# Altium footprint library 1.27贴片排母.PcbLib: 30 footprints (part 1 of 2)
Each footprint in its own frame and in the unit in brackets; x right, y up, seen from the top. Pads: shape width x height; smd on the part's side, far side on the other; paste and mask are expansions set on the pad; w line width, h text height; cw(c..) or ccw(c..) is an arc to the next point about the centre after c.
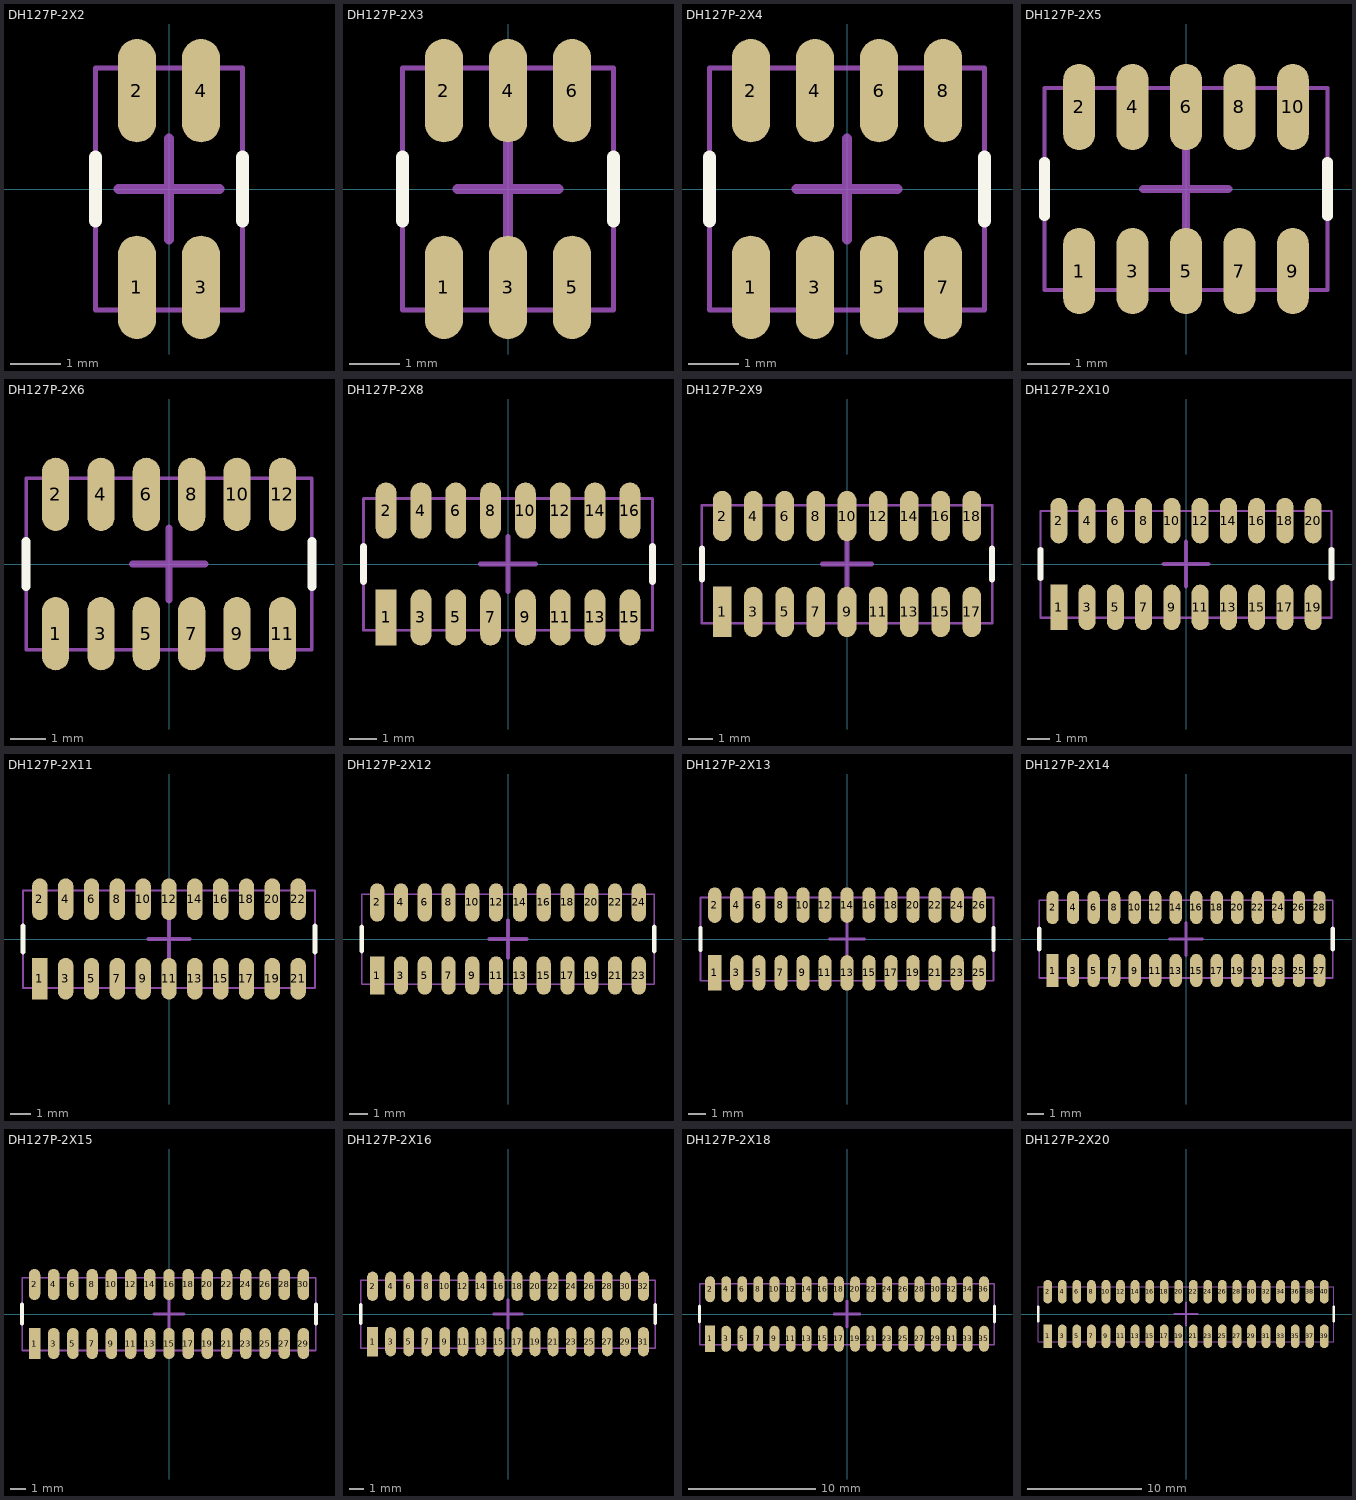
[diagram p0: the footprints below, top view; thin cyan lines are the x and y axes]

## DH127P-2X2 [mm] "1.27mm脚距双排母"
height 3.6
pads (4):
  oval 0.76x2.05 smd: 1(-0.635,-1.95) 2(-0.635,1.95) 3(0.635,-1.95) 4(0.635,1.95)
Top Overlay:
  lines w0.254: -1.46,-0.635 -1.46,0.635 ; 1.46,-0.635 1.46,0.635
Mechanical 13:
  lines w0.1: -1.46,-2.4 1.46,-2.4 1.46,2.4 -1.46,2.4 -1.46,-2.4
Mechanical 15:
  lines w0.2: -1,0 1,0 ; 0,-1 0,1
3D body: height 3.6, standoff -0.02, extent -1.46,-2.4 1.46,2.4

## DH127P-2X3 [mm] "1.27mm脚距双排母"
height 3.6
pads (6):
  oval 0.76x2.05 smd: 1(-1.27,-1.95) 2(-1.27,1.95) 3(0,-1.95) 4(0,1.95) 5(1.27,-1.95) 6(1.27,1.95)
Top Overlay:
  lines w0.254: -2.095,-0.635 -2.095,0.635 ; 2.095,-0.635 2.095,0.635
Mechanical 13:
  lines w0.1: -2.095,-2.4 -2.095,2.4 2.095,2.4 2.095,-2.4 -2.095,-2.4
Mechanical 15:
  lines w0.2: -1,0 1,0 ; 0,-1 0,1
3D body: height 3.6, standoff -0.02, extent -2.095,-2.4 2.095,2.4

## DH127P-2X4 [mm] "1.27mm脚距双排母"
height 3.6
pads (8):
  oval 0.76x2.05 smd: 1(-1.905,-1.95) 2(-1.905,1.95) 3(-0.635,-1.95) 4(-0.635,1.95) 5(0.635,-1.95) 6(0.635,1.95) 7(1.905,-1.95) 8(1.905,1.95)
Top Overlay:
  lines w0.254: -2.73,-0.635 -2.73,0.635 ; 2.73,-0.635 2.73,0.635
Mechanical 13:
  lines w0.1: -2.73,-2.4 -2.73,2.4 2.73,2.4 2.73,-2.4 -2.73,-2.4
Mechanical 15:
  lines w0.2: -1,0 1,0 ; 0,-1 0,1
3D body: height 3.6, standoff -0.02, extent -2.73,-2.4 2.73,2.4

## DH127P-2X5 [mm] "1.27mm脚距双排母"
height 3.6
pads (10):
  oval 0.76x2.05 smd: 1(-2.54,-1.95) 2(-2.54,1.95) 3(-1.27,-1.95) 4(-1.27,1.95) 5(0,-1.95) 6(0,1.95) 7(1.27,-1.95) 8(1.27,1.95) 9(2.54,-1.95) 10(2.54,1.95)
Top Overlay:
  lines w0.254: -3.365,-0.635 -3.365,0.635 ; 3.365,-0.635 3.365,0.635
Mechanical 13:
  lines w0.1: -3.365,-2.4 -3.365,2.4 3.365,2.4 3.365,-2.4 -3.365,-2.4
Mechanical 15:
  lines w0.2: -1.016,0 1,0 ; 0,-1 0,1
3D body: height 3.6, standoff -0.02, extent -3.365,-2.4 3.365,2.4

## DH127P-2X6 [mm] "1.27mm脚距双排母"
height 3.6
pads (12):
  oval 0.76x2.05 smd: 1(-3.175,-1.95) 2(-3.175,1.95) 3(-1.905,-1.95) 4(-1.905,1.95) 5(-0.635,-1.95) 6(-0.635,1.95) 7(0.635,-1.95) 8(0.635,1.95) 9(1.905,-1.95) 10(1.905,1.95) 11(3.175,-1.95) 12(3.175,1.95)
Top Overlay:
  lines w0.254: -4,-0.635 -4,0.635 ; 4,-0.635 4,0.635
Mechanical 13:
  lines w0.1: -4,-2.4 4,-2.4 4,2.4 -4,2.4 -4,-2.4
Mechanical 15:
  lines w0.2: -1.016,0 1,0 ; 0,-1 0,1
3D body: height 3.6, standoff -0.02, extent -4,-2.4 4,2.4

## DH127P-2X8 [mm] "1.27mm脚距双排母"
height 3.6
pads (16):
  rect 0.76x2.05 smd: 1(-4.445,-1.95)
  oval 0.76x2.05 smd: 2(-4.445,1.95) 3(-3.175,-1.95) 4(-3.175,1.95) 5(-1.905,-1.95) 6(-1.905,1.95) 7(-0.635,-1.95) 8(-0.635,1.95) 9(0.635,-1.95) 10(0.635,1.95) 11(1.905,-1.95) 12(1.905,1.95) 13(3.175,-1.95) 14(3.175,1.95) 15(4.445,-1.95) 16(4.445,1.95)
Top Overlay:
  lines w0.254: -5.27,-0.635 -5.27,0.635 ; 5.27,-0.635 5.27,0.635
Mechanical 13:
  lines w0.1: -5.27,-2.413 -5.27,2.387 5.27,2.387 5.27,-2.413 -5.27,-2.413
Mechanical 15:
  lines w0.2: -1,0 1,0 ; 0,-1 0,1
3D body: height 3.6, standoff -0.02, extent -5.27,-2.413 5.27,2.387

## DH127P-2X9 [mm] "1.27mm脚距双排母"
height 3.6
pads (18):
  rect 0.76x2.05 smd: 1(-5.08,-1.95)
  oval 0.76x2.05 smd: 2(-5.08,1.95) 3(-3.81,-1.95) 4(-3.81,1.95) 5(-2.54,-1.95) 6(-2.54,1.95) 7(-1.27,-1.95) 8(-1.27,1.95) 9(0,-1.95) 10(0,1.95) 11(1.27,-1.95) 12(1.27,1.95) 13(2.54,-1.95) 14(2.54,1.95) 15(3.81,-1.95) 16(3.81,1.95) 17(5.08,-1.95) 18(5.08,1.95)
Top Overlay:
  lines w0.254: -5.905,-0.635 -5.905,0.635 ; 5.905,-0.635 5.905,0.635
Mechanical 13:
  lines w0.1: -5.905,-2.413 -5.905,2.387 5.905,2.387 5.905,-2.413 -5.905,-2.413
Mechanical 15:
  lines w0.2: -1,0 1,0 ; 0,-1 0,1
3D body: height 3.6, standoff -0.02, extent -5.905,-2.413 5.905,2.387

## DH127P-2X10 [mm] "1.27mm脚距双排母"
height 3.6
pads (20):
  rect 0.76x2.05 smd: 1(-5.715,-1.95)
  oval 0.76x2.05 smd: 2(-5.715,1.95) 3(-4.445,-1.95) 4(-4.445,1.95) 5(-3.175,-1.95) 6(-3.175,1.95) 7(-1.905,-1.95) 8(-1.905,1.95) 9(-0.635,-1.95) 10(-0.635,1.95) 11(0.635,-1.95) 12(0.635,1.95) 13(1.905,-1.95) 14(1.905,1.95) 15(3.175,-1.95) 16(3.175,1.95) 17(4.445,-1.95) 18(4.445,1.95) 19(5.715,-1.95) 20(5.715,1.95)
Top Overlay:
  lines w0.254: -6.54,-0.635 -6.54,0.635 ; 6.54,-0.635 6.54,0.635
Mechanical 13:
  lines w0.1: -6.54,-2.413 -6.54,2.387 6.54,2.387 6.54,-2.413 -6.54,-2.413
Mechanical 15:
  lines w0.2: -1,0 1,0 ; 0,-1 0,1
3D body: height 3.6, standoff -0.02, extent -6.54,-2.413 6.54,2.387

## DH127P-2X11 [mm] "1.27mm脚距双排母"
height 3.6
pads (22):
  rect 0.76x2.05 smd: 1(-6.35,-1.95)
  oval 0.76x2.05 smd: 2(-6.35,1.95) 3(-5.08,-1.95) 4(-5.08,1.95) 5(-3.81,-1.95) 6(-3.81,1.95) 7(-2.54,-1.95) 8(-2.54,1.95) 9(-1.27,-1.95) 10(-1.27,1.95) 11(0,-1.95) 12(0,1.95) 13(1.27,-1.95) 14(1.27,1.95) 15(2.54,-1.95) 16(2.54,1.95) 17(3.81,-1.95) 18(3.81,1.95) 19(5.08,-1.95) 20(5.08,1.95) 21(6.35,-1.95) 22(6.35,1.95)
Top Overlay:
  lines w0.254: -7.175,-0.635 -7.175,0.635 ; 7.175,-0.635 7.175,0.635
Mechanical 13:
  lines w0.1: -7.175,-2.413 -7.175,2.387 7.175,2.387 7.175,-2.413 -7.175,-2.413
Mechanical 15:
  lines w0.2: -1,0 1,0 ; 0,-1 0,1
3D body: height 3.6, standoff -0.02, extent -7.175,-2.413 7.175,2.387

## DH127P-2X12 [mm] "1.27mm脚距双排母"
height 3.6
pads (24):
  rect 0.76x2.05 smd: 1(-6.985,-1.95)
  oval 0.76x2.05 smd: 2(-6.985,1.95) 3(-5.715,-1.95) 4(-5.715,1.95) 5(-4.445,-1.95) 6(-4.445,1.95) 7(-3.175,-1.95) 8(-3.175,1.95) 9(-1.905,-1.95) 10(-1.905,1.95) 11(-0.635,-1.95) 12(-0.635,1.95) 13(0.635,-1.95) 14(0.635,1.95) 15(1.905,-1.95) 16(1.905,1.95) 17(3.175,-1.95) 18(3.175,1.95) 19(4.445,-1.95) 20(4.445,1.95) 21(5.715,-1.95) 22(5.715,1.95) 23(6.985,-1.95) 24(6.985,1.95)
Top Overlay:
  lines w0.254: -7.81,-0.635 -7.81,0.635 ; 7.81,-0.635 7.81,0.635
Mechanical 13:
  lines w0.1: -7.81,-2.413 7.81,-2.413 7.81,2.387 -7.81,2.387 -7.81,-2.413
Mechanical 15:
  lines w0.2: -1,0 1,0 ; 0,-1 0,1
3D body: height 3.6, standoff -0.02, extent -7.81,-2.413 7.81,2.387

## DH127P-2X13 [mm] "1.27mm脚距双排母"
height 3.6
pads (26):
  rect 0.76x2.05 smd: 1(-7.62,-1.95)
  oval 0.76x2.05 smd: 2(-7.62,1.95) 3(-6.35,-1.95) 4(-6.35,1.95) 5(-5.08,-1.95) 6(-5.08,1.95) 7(-3.81,-1.95) 8(-3.81,1.95) 9(-2.54,-1.95) 10(-2.54,1.95) 11(-1.27,-1.95) 12(-1.27,1.95) 13(0,-1.95) 14(0,1.95) 15(1.27,-1.95) 16(1.27,1.95) 17(2.54,-1.95) 18(2.54,1.95) 19(3.81,-1.95) 20(3.81,1.95) 21(5.08,-1.95) 22(5.08,1.95) 23(6.35,-1.95) 24(6.35,1.95) 25(7.62,-1.95) 26(7.62,1.95)
Top Overlay:
  lines w0.254: -8.445,-0.635 -8.445,0.635 ; 8.445,-0.635 8.445,0.635
Mechanical 13:
  lines w0.1: -8.445,-2.413 8.445,-2.413 8.445,2.387 -8.445,2.387 -8.445,-2.413
Mechanical 15:
  lines w0.2: -1,0 1,0 ; 0,-1 0,1
3D body: height 3.6, standoff -0.02, extent -8.445,-2.413 8.445,2.387

## DH127P-2X14 [mm] "1.27mm脚距双排母"
height 3.6
pads (28):
  rect 0.76x2.05 smd: 1(-8.255,-1.95)
  oval 0.76x2.05 smd: 2(-8.255,1.95) 3(-6.985,-1.95) 4(-6.985,1.95) 5(-5.715,-1.95) 6(-5.715,1.95) 7(-4.445,-1.95) 8(-4.445,1.95) 9(-3.175,-1.95) 10(-3.175,1.95) 11(-1.905,-1.95) 12(-1.905,1.95) 13(-0.635,-1.95) 14(-0.635,1.95) 15(0.635,-1.95) 16(0.635,1.95) 17(1.905,-1.95) 18(1.905,1.95) 19(3.175,-1.95) 20(3.175,1.95) 21(4.445,-1.95) 22(4.445,1.95) 23(5.715,-1.95) 24(5.715,1.95) 25(6.985,-1.95) 26(6.985,1.95) 27(8.255,-1.95) 28(8.255,1.95)
Top Overlay:
  lines w0.254: -9.08,-0.635 -9.08,0.635 ; 9.08,-0.635 9.08,0.635
Mechanical 13:
  lines w0.1: -9.08,-2.413 9.08,-2.413 9.08,2.387 -9.08,2.387 -9.08,-2.413
Mechanical 15:
  lines w0.2: -1,0 1,0 ; 0,-1 0,1
3D body: height 3.6, standoff -0.02, extent -9.08,-2.413 9.08,2.387

## DH127P-2X15 [mm] "1.27mm脚距双排母"
height 3.6
pads (30):
  rect 0.76x2.05 smd: 1(-8.89,-1.95)
  oval 0.76x2.05 smd: 2(-8.89,1.95) 3(-7.62,-1.95) 4(-7.62,1.95) 5(-6.35,-1.95) 6(-6.35,1.95) 7(-5.08,-1.95) 8(-5.08,1.95) 9(-3.81,-1.95) 10(-3.81,1.95) 11(-2.54,-1.95) 12(-2.54,1.95) 13(-1.27,-1.95) 14(-1.27,1.95) 15(0,-1.95) 16(0,1.95) 17(1.27,-1.95) 18(1.27,1.95) 19(2.54,-1.95) 20(2.54,1.95) 21(3.81,-1.95) 22(3.81,1.95) 23(5.08,-1.95) 24(5.08,1.95) 25(6.35,-1.95) 26(6.35,1.95) 27(7.62,-1.95) 28(7.62,1.95) 29(8.89,-1.95) 30(8.89,1.95)
Top Overlay:
  lines w0.254: -9.715,-0.635 -9.715,0.635 ; 9.715,-0.635 9.715,0.635
Mechanical 13:
  lines w0.1: -9.715,-2.413 -9.715,2.387 9.715,2.387 9.715,-2.413 -9.715,-2.413
Mechanical 15:
  lines w0.2: -1,0 1,0 ; 0,-1 0,1
3D body: height 3.6, standoff -0.02, extent -9.715,-2.413 9.715,2.387

## DH127P-2X16 [mm] "1.27mm脚距双排母"
height 3.6
pads (32):
  rect 0.76x2.05 smd: 1(-9.525,-1.95)
  oval 0.76x2.05 smd: 2(-9.525,1.95) 3(-8.255,-1.95) 4(-8.255,1.95) 5(-6.985,-1.95) 6(-6.985,1.95) 7(-5.715,-1.95) 8(-5.715,1.95) 9(-4.445,-1.95) 10(-4.445,1.95) 11(-3.175,-1.95) 12(-3.175,1.95) 13(-1.905,-1.95) 14(-1.905,1.95) 15(-0.635,-1.95) 16(-0.635,1.95) 17(0.635,-1.95) 18(0.635,1.95) 19(1.905,-1.95) 20(1.905,1.95) 21(3.175,-1.95) 22(3.175,1.95) 23(4.445,-1.95) 24(4.445,1.95) 25(5.715,-1.95) 26(5.715,1.95) 27(6.985,-1.95) 28(6.985,1.95) 29(8.255,-1.95) 30(8.255,1.95) 31(9.525,-1.95) 32(9.525,1.95)
Top Overlay:
  lines w0.254: -10.35,-0.635 -10.35,0.635 ; 10.35,-0.635 10.35,0.635
Mechanical 13:
  lines w0.1: -10.35,-2.413 10.35,-2.413 10.35,2.387 -10.35,2.387 -10.35,-2.413
Mechanical 15:
  lines w0.2: -1,0 1,0 ; 0,-1 0,1
3D body: height 3.6, standoff -0.02, extent -10.35,-2.413 10.35,2.387

## DH127P-2X18 [mm] "1.27mm脚距双排母"
height 3.6
pads (36):
  rect 0.76x2.05 smd: 1(-10.795,-1.95)
  oval 0.76x2.05 smd: 2(-10.795,1.95) 3(-9.525,-1.95) 4(-9.525,1.95) 5(-8.255,-1.95) 6(-8.255,1.95) 7(-6.985,-1.95) 8(-6.985,1.95) 9(-5.715,-1.95) 10(-5.715,1.95) 11(-4.445,-1.95) 12(-4.445,1.95) 13(-3.175,-1.95) 14(-3.175,1.95) 15(-1.905,-1.95) 16(-1.905,1.95) 17(-0.635,-1.95) 18(-0.635,1.95) 19(0.635,-1.95) 20(0.635,1.95) 21(1.905,-1.95) 22(1.905,1.95) 23(3.175,-1.95) 24(3.175,1.95) 25(4.445,-1.95) 26(4.445,1.95) 27(5.715,-1.95) 28(5.715,1.95) 29(6.985,-1.95) 30(6.985,1.95) 31(8.255,-1.95) 32(8.255,1.95) 33(9.525,-1.95) 34(9.525,1.95) 35(10.795,-1.95) 36(10.795,1.95)
Top Overlay:
  lines w0.254: -11.62,-0.635 -11.62,0.635 ; 11.62,-0.635 11.62,0.635
Mechanical 13:
  lines w0.1: -11.62,-2.413 -11.62,2.387 11.62,2.387 11.62,-2.413 -11.62,-2.413
Mechanical 15:
  lines w0.2: -1,0 1,0 ; 0,-1 0,1
3D body: height 3.6, standoff -0.02, extent -11.62,-2.413 11.62,2.387

## DH127P-2X20 [mm] "1.27mm脚距双排母"
height 3.6
pads (40):
  rect 0.76x2.05 smd: 1(-12.065,-1.95)
  oval 0.76x2.05 smd: 2(-12.065,1.95) 3(-10.795,-1.95) 4(-10.795,1.95) 5(-9.525,-1.95) 6(-9.525,1.95) 7(-8.255,-1.95) 8(-8.255,1.95) 9(-6.985,-1.95) 10(-6.985,1.95) 11(-5.715,-1.95) 12(-5.715,1.95) 13(-4.445,-1.95) 14(-4.445,1.95) 15(-3.175,-1.95) 16(-3.175,1.95) 17(-1.905,-1.95) 18(-1.905,1.95) 19(-0.635,-1.95) 20(-0.635,1.95) 21(0.635,-1.95) 22(0.635,1.95) 23(1.905,-1.95) 24(1.905,1.95) 25(3.175,-1.95) 26(3.175,1.95) 27(4.445,-1.95) 28(4.445,1.95) 29(5.715,-1.95) 30(5.715,1.95) 31(6.985,-1.95) 32(6.985,1.95) 33(8.255,-1.95) 34(8.255,1.95) 35(9.525,-1.95) 36(9.525,1.95) 37(10.795,-1.95) 38(10.795,1.95) 39(12.065,-1.95) 40(12.065,1.95)
Top Overlay:
  lines w0.254: -12.89,-0.635 -12.89,0.635 ; 12.89,-0.635 12.89,0.635
Mechanical 13:
  lines w0.1: -12.89,-2.413 -12.89,2.387 12.89,2.387 12.89,-2.413 -12.89,-2.413
Mechanical 15:
  lines w0.2: -1,0 1,0 ; 0,-1 0,1
3D body: height 3.6, standoff -0.02, extent -12.89,-2.413 12.89,2.387